# Altium schematic symbol library TI Power Management Shunt Voltage Reference.SchLib: 1526 symbols (part 14 of 18)
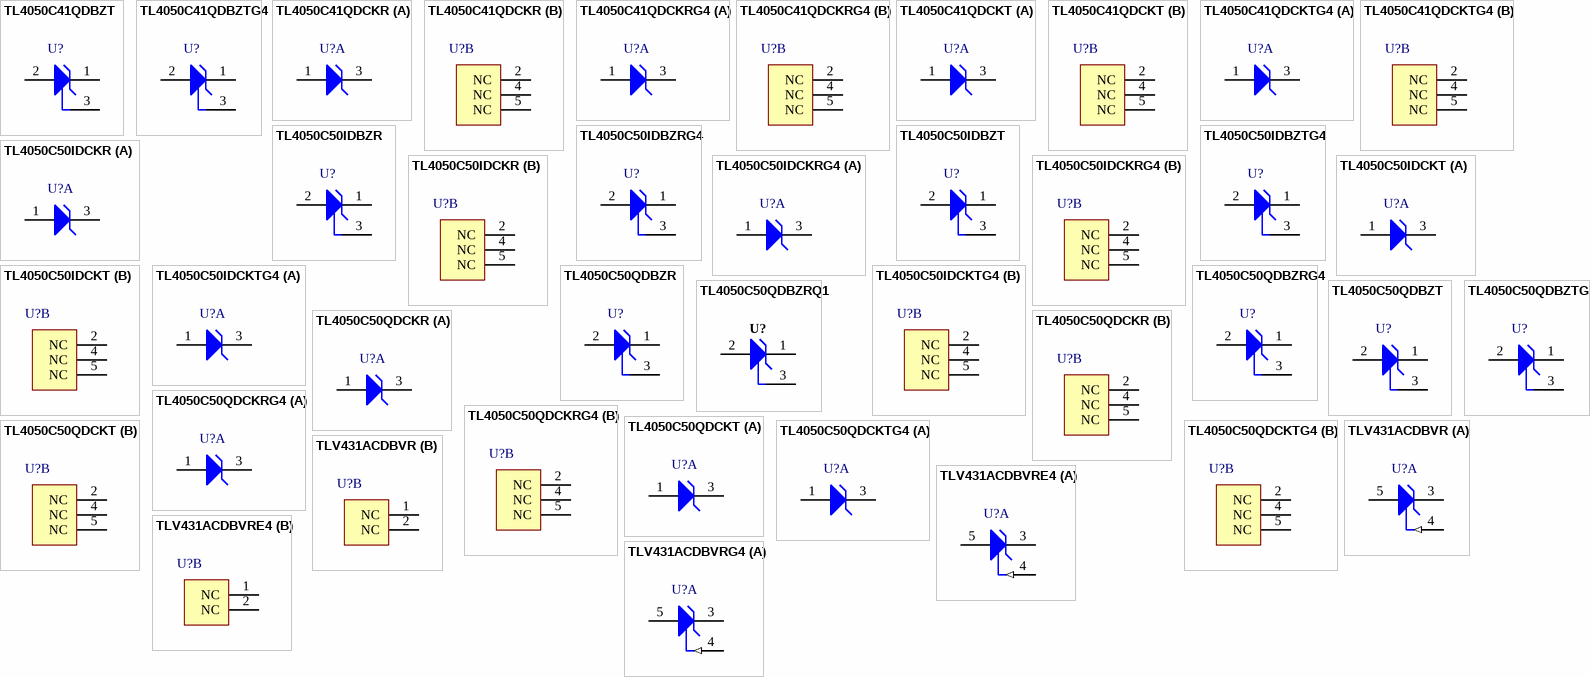
[diagram p70: symbols TL4050C41QDBZT to TLV431ACDBVRG4]

## TL4050C50QDCKR
designator U?
Precision Micropower Shunt Voltage Reference, 5 V, -40 to 125 degC, 5-pin SC70 (DCK), Green (RoHS & no Sb/Br); Manufacturer: Texas Instruments; PartNumber: TL4050C50QDCKR; Initial Accuracy @ 25/deg C(%): 0.5; Rating: Catalog; Temp Coeff(Max)(ppm/ degree C): 50; VO(V): 5; DatasheetVersion: SLOS486A; PackageReference: DCK5; PackageDescription: 5-Pin Plastic Small-Outline Package, 2 x 1.3 mm Body, 0.65 mm Pitch, 2.1 mm Lead Span; Supplier 1: Digi-Key; Supplier Part Number 1: 296-22826-2-ND; Supplier 2: Digi-Key; Supplier Part Number 2: 296-22826-1-ND; Supplier 3: Digi-Key; Supplier Part Number 3: 296-22826-6-ND; Supplier 4: Newark; Supplier Part Number 4: 46M1023; Supplier 5: Mouser; Supplier Part Number 5: 595-TL4050C50QDCKR; Eco-Plan: Green (RoHS & no Sb/Br); SubFamily: Shunt Voltage Reference; Mounting Technology: Surface Mount; Code_JEDEC: MO-203; ComponentLink1Description: Manufacturer URL; ComponentLink1URL: http://www.ti.com/; ComponentLink2Description: Datasheet; ComponentLink2URL: http://www.ti.com/general/docs/lit/getliterature.tsp?genericPartNumber=TL4050C50&fileType=pdf; ComponentLink3Description: Package Specification; ComponentLink3URL: http://www.ti.com/litv/pdf/mpds025f
footprint TI-DCK5_N (SOT353, 5-Leads, Body 2x1.3mm, Pitch 0.65mm, Lead Span 2.1mm, IPC Medium Density)
part A pins: 1 ANODE, 3 CATHODE
part B pins: 2 NC "No internal connection", 4 NC "No internal connection", 5 NC "No internal connection"

## TL4050C50QDCKRG4
designator U?
Precision Micropower Shunt Voltage Reference, 5 V, -40 to 125 degC, 5-pin SC70 (DCK), Green (RoHS & no Sb/Br); Manufacturer: Texas Instruments; PartNumber: TL4050C50QDCKRG4; Initial Accuracy @ 25/deg C(%): 0.5; Rating: Catalog; Temp Coeff(Max)(ppm/ degree C): 50; VO(V): 5; DatasheetVersion: SLOS486A; PackageReference: DCK5; PackageDescription: 5-Pin Plastic Small-Outline Package, 2 x 1.3 mm Body, 0.65 mm Pitch, 2.1 mm Lead Span; Supplier 1: Digi-Key; Supplier Part Number 1: TL4050C50QDCKRG4-ND; Supplier 2: Newark; Supplier Part Number 2: 46M9218; Supplier 3: Mouser; Supplier Part Number 3: 595-TL4050C50QDCKRG4; Eco-Plan: Green (RoHS & no Sb/Br); SubFamily: Shunt Voltage Reference; Mounting Technology: Surface Mount; Code_JEDEC: MO-203; ComponentLink1Description: Manufacturer URL; ComponentLink1URL: http://www.ti.com/; ComponentLink2Description: Datasheet; ComponentLink2URL: http://www.ti.com/general/docs/lit/getliterature.tsp?genericPartNumber=TL4050C50&fileType=pdf; ComponentLink3Description: Package Specification; ComponentLink3URL: http://www.ti.com/litv/pdf/mpds025f
footprint TI-DCK5_N (SOT353, 5-Leads, Body 2x1.3mm, Pitch 0.65mm, Lead Span 2.1mm, IPC Medium Density)
part A pins: 1 ANODE, 3 CATHODE
part B pins: 2 NC "No internal connection", 4 NC "No internal connection", 5 NC "No internal connection"

## TL4050C50QDCKT
designator U?
Precision Micropower Shunt Voltage Reference, 5 V, -40 to 125 degC, 5-pin SC70 (DCK), Green (RoHS & no Sb/Br); Manufacturer: Texas Instruments; PartNumber: TL4050C50QDCKT; Initial Accuracy @ 25/deg C(%): 0.5; Rating: Catalog; VO(V): 5; DatasheetVersion: SLOS486A; PackageReference: DCK5; PackageDescription: 5-Pin Plastic Small-Outline Package, 2 x 1.3 mm Body, 0.65 mm Pitch, 2.1 mm Lead Span; Supplier 1: Digi-Key; Supplier Part Number 1: TL4050C50QDCKT-ND; Supplier 2: Mouser; Supplier Part Number 2: 595-TL4050C50QDCKT; Eco-Plan: Green (RoHS & no Sb/Br); SubFamily: Shunt Voltage Reference; Mounting Technology: Surface Mount; Code_JEDEC: MO-203; ComponentLink1Description: Manufacturer URL; ComponentLink1URL: http://www.ti.com/; ComponentLink2Description: Datasheet; ComponentLink2URL: http://www.ti.com/general/docs/lit/getliterature.tsp?genericPartNumber=TL4050C50&fileType=pdf; ComponentLink3Description: Package Specification; ComponentLink3URL: http://www.ti.com/litv/pdf/mpds025f; ComponentLink4Description: URL Link1; ComponentLink4URL: Samples URL:http://www.ti.com/general/docs/lit/getliterature.tsp?genericPartNumber=tl4050c50&fileType=pdf
footprint TI-DCK5_N (SOT353, 5-Leads, Body 2x1.3mm, Pitch 0.65mm, Lead Span 2.1mm, IPC Medium Density)
part A pins: 1 ANODE, 3 CATHODE
part B pins: 2 NC "No internal connection", 4 NC "No internal connection", 5 NC "No internal connection"

## TL4050C50QDCKTG4
designator U?
Precision Micropower Shunt Voltage Reference, 5 V, -40 to 125 degC, 5-pin SC70 (DCK), Green (RoHS & no Sb/Br); Manufacturer: Texas Instruments; PartNumber: TL4050C50QDCKTG4; Initial Accuracy @ 25/deg C(%): 0.5; Rating: Catalog; VO(V): 5; DatasheetVersion: SLOS486A; PackageReference: DCK5; PackageDescription: 5-Pin Plastic Small-Outline Package, 2 x 1.3 mm Body, 0.65 mm Pitch, 2.1 mm Lead Span; Supplier 1: Digi-Key; Supplier Part Number 1: TL4050C50QDCKTG4-ND; Supplier 2: Mouser; Supplier Part Number 2: 595-TL4050C50QDCKTG4; Eco-Plan: Green (RoHS & no Sb/Br); SubFamily: Shunt Voltage Reference; Mounting Technology: Surface Mount; Code_JEDEC: MO-203; ComponentLink1Description: Manufacturer URL; ComponentLink1URL: http://www.ti.com/; ComponentLink2Description: Datasheet; ComponentLink2URL: http://www.ti.com/general/docs/lit/getliterature.tsp?genericPartNumber=TL4050C50&fileType=pdf; ComponentLink3Description: Package Specification; ComponentLink3URL: http://www.ti.com/litv/pdf/mpds025f; ComponentLink4Description: URL Link1; ComponentLink4URL: Samples URL:http://www.ti.com/general/docs/lit/getliterature.tsp?genericPartNumber=tl4050c50&fileType=pdf
footprint TI-DCK5_N (SOT353, 5-Leads, Body 2x1.3mm, Pitch 0.65mm, Lead Span 2.1mm, IPC Medium Density)
part A pins: 1 ANODE, 3 CATHODE
part B pins: 2 NC "No internal connection", 4 NC "No internal connection", 5 NC "No internal connection"

## TLV431ACDBVR
designator U?
Low Voltage Adjustable Precision Shunt Regulator, 39 ppm / degC, 15 mA, 0 to 70 degC, 5-pin SOT-23 (DBV), Green (RoHS & no Sb/Br); Manufacturer: Texas Instruments; PartNumber: TLV431ACDBVR; Iout/Iz(Max)(mA): 15; Min Iz for Regulation(uA): 80; Rating: Catalog; SubFamily: Shunt Voltage Reference; Temp Coeff(Max)(ppm/ degree C): 129; Temp Coeff(Typ)(ppm/ degree C): 39; VO Adj(Max)(V): 6; VO Adj(Min)(V): 1.24; DatasheetVersion: SLVS139T; PackageVersion: 4073253-4/K; PackageReference: DBV5; PackageDescription: 5-Pin Plastic Small Outline, Body 1.60 ?2.90 mm, Pitch 0.95 mm; Supplier 1: Digi-Key; Supplier Part Number 1: 296-1348-2-ND; Supplier 2: Digi-Key; Supplier Part Number 2: 296-1348-1-ND; Supplier 3: Digi-Key; Supplier Part Number 3: 296-1348-6-ND; Supplier 4: Farnell; Supplier Part Number 4: 1287662; Supplier 5: Newark; Supplier Part Number 5: 76K1064; Supplier 6: Mouser; Supplier Part Number 6: 595-TLV431ACDBVR; Eco-Plan: Green (RoHS & no Sb/Br); Mounting Technology: Surface Mount; Code_JEDEC: MO-178; ComponentLink1Description: Manufacturer URL; ComponentLink1URL: http://www.ti.com/; ComponentLink2Description: Datasheet; ComponentLink2URL: http://www.ti.com/general/docs/lit/getliterature.tsp?genericPartNumber=TLV431A&fileType=pdf; ComponentLink3Description: Package Specification; ComponentLink3URL: http://www.ti.com/litv/pdf/mpds018i
footprint TI-DBV5_N (SOT23, 5-Leads, Body 2.9x1.6mm, Pitch 0.95mm, IPC Medium Density)
part A pins: 3 CATHODE, 4 REF (in), 5 ANODE
part B pins: 1 NC "No internal connection", 2 NC "No internal connection"

## TLV431ACDBVRE4
designator U?
Low Voltage Adjustable Precision Shunt Regulator, 39 ppm / degC, 15 mA, 0 to 70 degC, 5-pin SOT-23 (DBV), Green (RoHS & no Sb/Br); Manufacturer: Texas Instruments; PartNumber: TLV431ACDBVRE4; Iout/Iz(Max)(mA): 15; Min Iz for Regulation(uA): 80; Rating: Catalog; SubFamily: Shunt Voltage Reference; Temp Coeff(Max)(ppm/ degree C): 129; Temp Coeff(Typ)(ppm/ degree C): 39; VO Adj(Max)(V): 6; VO Adj(Min)(V): 1.24; DatasheetVersion: SLVS139T; PackageVersion: 4073253-4/K; PackageReference: DBV5; PackageDescription: 5-Pin Plastic Small Outline, Body 1.60 ?2.90 mm, Pitch 0.95 mm; Supplier 1: Digi-Key; Supplier Part Number 1: TLV431ACDBVRE4-ND; Supplier 2: Newark; Supplier Part Number 2: 40K9631; Supplier 3: Mouser; Supplier Part Number 3: 595-TLV431ACDBVRE4; Eco-Plan: Green (RoHS & no Sb/Br); Mounting Technology: Surface Mount; Code_JEDEC: MO-178; ComponentLink1Description: Manufacturer URL; ComponentLink1URL: http://www.ti.com/; ComponentLink2Description: Datasheet; ComponentLink2URL: http://www.ti.com/general/docs/lit/getliterature.tsp?genericPartNumber=TLV431A&fileType=pdf; ComponentLink3Description: Package Specification; ComponentLink3URL: http://www.ti.com/litv/pdf/mpds018i
footprint TI-DBV5_N (SOT23, 5-Leads, Body 2.9x1.6mm, Pitch 0.95mm, IPC Medium Density)
part A pins: 3 CATHODE, 4 REF (in), 5 ANODE
part B pins: 1 NC "No internal connection", 2 NC "No internal connection"

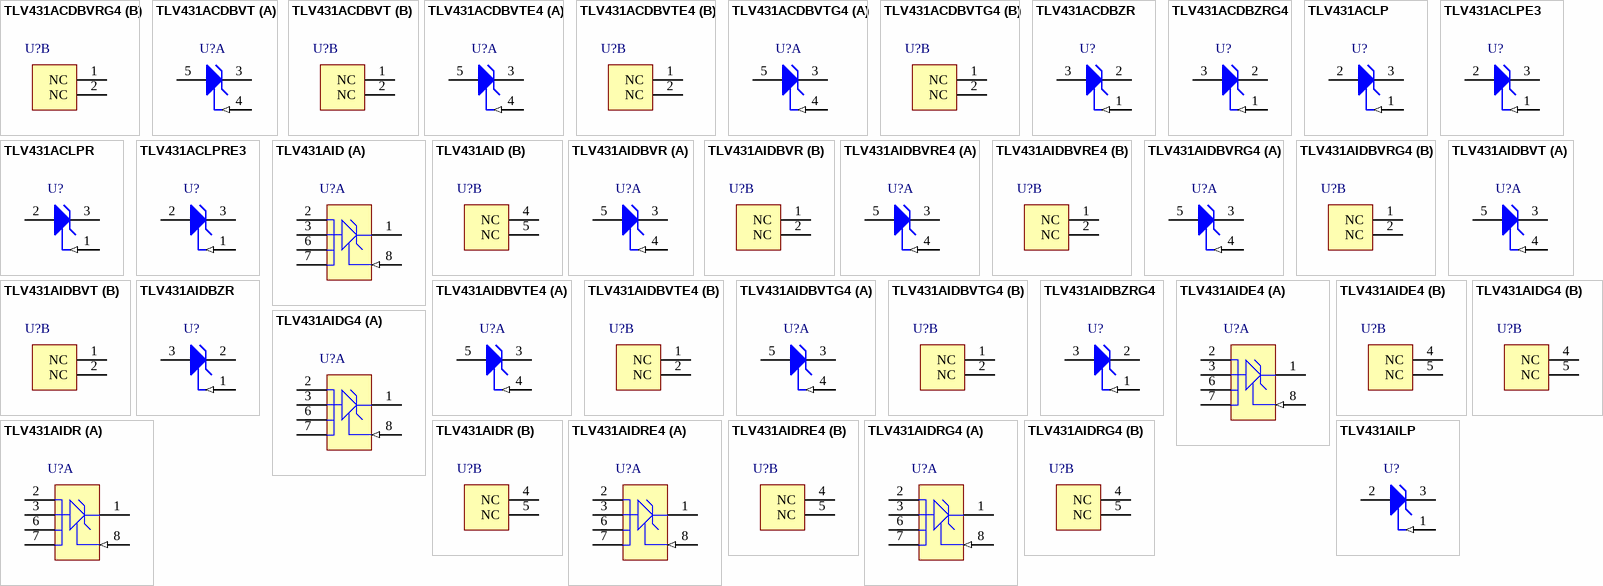
[diagram p43: symbols TLV431ACDBVRG4 to TLV431AILP]

## TLV431ACDBVRG4
designator U?
Low Voltage Adjustable Precision Shunt Regulator, 39 ppm / degC, 15 mA, 0 to 70 degC, 5-pin SOT-23 (DBV), Green (RoHS & no Sb/Br); Manufacturer: Texas Instruments; PartNumber: TLV431ACDBVRG4; Iout/Iz(Max)(mA): 15; Min Iz for Regulation(uA): 80; Rating: Catalog; SubFamily: Shunt Voltage Reference; Temp Coeff(Max)(ppm/ degree C): 129; Temp Coeff(Typ)(ppm/ degree C): 39; VO Adj(Max)(V): 6; VO Adj(Min)(V): 1.24; DatasheetVersion: SLVS139T; PackageVersion: 4073253-4/K; PackageReference: DBV5; PackageDescription: 5-Pin Plastic Small Outline, Body 1.60 ?2.90 mm, Pitch 0.95 mm; Supplier 1: Digi-Key; Supplier Part Number 1: TLV431ACDBVRG4-ND; Supplier 2: Farnell; Supplier Part Number 2: 1287663; Supplier 3: Newark; Supplier Part Number 3: 26M4181; Supplier 4: Mouser; Supplier Part Number 4: 595-TLV431ACDBVRG4; Eco-Plan: Green (RoHS & no Sb/Br); Mounting Technology: Surface Mount; Code_JEDEC: MO-178; ComponentLink1Description: Manufacturer URL; ComponentLink1URL: http://www.ti.com/; ComponentLink2Description: Datasheet; ComponentLink2URL: http://www.ti.com/general/docs/lit/getliterature.tsp?genericPartNumber=TLV431A&fileType=pdf; ComponentLink3Description: Package Specification; ComponentLink3URL: http://www.ti.com/litv/pdf/mpds018i
footprint TI-DBV5_N (SOT23, 5-Leads, Body 2.9x1.6mm, Pitch 0.95mm, IPC Medium Density)
part A pins: 3 CATHODE, 4 REF (in), 5 ANODE
part B pins: 1 NC "No internal connection", 2 NC "No internal connection"

## TLV431ACDBVT
designator U?
Low Voltage Adjustable Precision Shunt Regulator, 39 ppm / degC, 15 mA, 0 to 70 degC, 5-pin SOT-23 (DBV), Green (RoHS & no Sb/Br); Manufacturer: Texas Instruments; PartNumber: TLV431ACDBVT; Iout/Iz(Max)(mA): 15; Min Iz for Regulation(uA): 80; Rating: Catalog; SubFamily: Shunt Voltage Reference; Temp Coeff(Max)(ppm/ degree C): 129; Temp Coeff(Typ)(ppm/ degree C): 39; VO Adj(Max)(V): 6; VO Adj(Min)(V): 1.24; DatasheetVersion: SLVS139T; PackageVersion: 4073253-4/K; PackageReference: DBV5; PackageDescription: 5-Pin Plastic Small Outline, Body 1.60 ?2.90 mm, Pitch 0.95 mm; Supplier 1: Digi-Key; Supplier Part Number 1: 296-32396-2-ND; Supplier 2: Digi-Key; Supplier Part Number 2: 296-32396-1-ND; Supplier 3: Digi-Key; Supplier Part Number 3: 296-32396-6-ND; Supplier 4: Mouser; Supplier Part Number 4: 595-TLV431ACDBVT; Eco-Plan: Green (RoHS & no Sb/Br); Mounting Technology: Surface Mount; Code_JEDEC: MO-178; ComponentLink1Description: Manufacturer URL; ComponentLink1URL: http://www.ti.com/; ComponentLink2Description: Datasheet; ComponentLink2URL: http://www.ti.com/general/docs/lit/getliterature.tsp?genericPartNumber=TLV431A&fileType=pdf; ComponentLink3Description: Package Specification; ComponentLink3URL: http://www.ti.com/litv/pdf/mpds018i
footprint TI-DBV5_N (SOT23, 5-Leads, Body 2.9x1.6mm, Pitch 0.95mm, IPC Medium Density)
part A pins: 3 CATHODE, 4 REF (in), 5 ANODE
part B pins: 1 NC "No internal connection", 2 NC "No internal connection"

## TLV431ACDBVTE4
designator U?
Low Voltage Adjustable Precision Shunt Regulator, 39 ppm / degC, 15 mA, 0 to 70 degC, 5-pin SOT-23 (DBV), Green (RoHS & no Sb/Br); Manufacturer: Texas Instruments; PartNumber: TLV431ACDBVTE4; Iout/Iz(Max)(mA): 15; Min Iz for Regulation(uA): 80; Rating: Catalog; SubFamily: Shunt Voltage Reference; Temp Coeff(Max)(ppm/ degree C): 129; Temp Coeff(Typ)(ppm/ degree C): 39; VO Adj(Max)(V): 6; VO Adj(Min)(V): 1.24; DatasheetVersion: SLVS139T; PackageVersion: 4073253-4/K; PackageReference: DBV5; PackageDescription: 5-Pin Plastic Small Outline, Body 1.60 ?2.90 mm, Pitch 0.95 mm; Supplier 1: Digi-Key; Supplier Part Number 1: TLV431ACDBVTE4-ND; Supplier 2: Mouser; Supplier Part Number 2: 595-TLV431ACDBVTE4; Eco-Plan: Green (RoHS & no Sb/Br); Mounting Technology: Surface Mount; Code_JEDEC: MO-178; ComponentLink1Description: Manufacturer URL; ComponentLink1URL: http://www.ti.com/; ComponentLink2Description: Datasheet; ComponentLink2URL: http://www.ti.com/general/docs/lit/getliterature.tsp?genericPartNumber=TLV431A&fileType=pdf; ComponentLink3Description: Package Specification; ComponentLink3URL: http://www.ti.com/litv/pdf/mpds018i
footprint TI-DBV5_N (SOT23, 5-Leads, Body 2.9x1.6mm, Pitch 0.95mm, IPC Medium Density)
part A pins: 3 CATHODE, 4 REF (in), 5 ANODE
part B pins: 1 NC "No internal connection", 2 NC "No internal connection"

## TLV431ACDBVTG4
designator U?
Low Voltage Adjustable Precision Shunt Regulator, 39 ppm / degC, 15 mA, 0 to 70 degC, 5-pin SOT-23 (DBV), Green (RoHS & no Sb/Br); Manufacturer: Texas Instruments; PartNumber: TLV431ACDBVTG4; Iout/Iz(Max)(mA): 15; Min Iz for Regulation(uA): 80; Rating: Catalog; SubFamily: Shunt Voltage Reference; Temp Coeff(Max)(ppm/ degree C): 129; Temp Coeff(Typ)(ppm/ degree C): 39; VO Adj(Max)(V): 6; VO Adj(Min)(V): 1.24; DatasheetVersion: SLVS139T; PackageVersion: 4073253-4/K; PackageReference: DBV5; PackageDescription: 5-Pin Plastic Small Outline, Body 1.60 ?2.90 mm, Pitch 0.95 mm; Supplier 1: Digi-Key; Supplier Part Number 1: TLV431ACDBVTG4-ND; Supplier 2: Newark; Supplier Part Number 2: 53M3977; Supplier 3: Mouser; Supplier Part Number 3: 595-TLV431ACDBVTG4; Eco-Plan: Green (RoHS & no Sb/Br); Mounting Technology: Surface Mount; Code_JEDEC: MO-178; ComponentLink1Description: Manufacturer URL; ComponentLink1URL: http://www.ti.com/; ComponentLink2Description: Datasheet; ComponentLink2URL: http://www.ti.com/general/docs/lit/getliterature.tsp?genericPartNumber=TLV431A&fileType=pdf; ComponentLink3Description: Package Specification; ComponentLink3URL: http://www.ti.com/litv/pdf/mpds018i
footprint TI-DBV5_N (SOT23, 5-Leads, Body 2.9x1.6mm, Pitch 0.95mm, IPC Medium Density)
part A pins: 3 CATHODE, 4 REF (in), 5 ANODE
part B pins: 1 NC "No internal connection", 2 NC "No internal connection"

## TLV431ACDBZR
designator U?
Low Voltage Adjustable Precision Shunt Regulator, 39 ppm / degC, 15 mA, 0 to 70 degC, 3-pin SOT-23 (DBZ), Green (RoHS & no Sb/Br); Manufacturer: Texas Instruments; PartNumber: TLV431ACDBZR; Iout/Iz(Max)(mA): 15; Min Iz for Regulation(uA): 80; Rating: Catalog; SubFamily: Shunt Voltage Reference; Temp Coeff(Max)(ppm/ degree C): 129; Temp Coeff(Typ)(ppm/ degree C): 39; VO Adj(Max)(V): 6; VO Adj(Min)(V): 1.24; DatasheetVersion: SLVS139T; PackageVersion: 4203227/B; PackageReference: DBZ3; PackageDescription: 3-Pin Plastic Small Outline, Body 2.92 x 1.3 mm, Pitch 0.95 mm; Supplier 1: Digi-Key; Supplier Part Number 1: 296-18912-2-ND; Supplier 2: Digi-Key; Supplier Part Number 2: 296-18912-1-ND; Supplier 3: Digi-Key; Supplier Part Number 3: 296-18912-6-ND; Supplier 4: Newark; Supplier Part Number 4: 21J9150; Supplier 5: Mouser; Supplier Part Number 5: 595-TLV431ACDBZR; Eco-Plan: Green (RoHS & no Sb/Br); Mounting Technology: Surface Mount; Code_JEDEC: TO-236; ComponentLink1Description: Manufacturer URL; ComponentLink1URL: http://www.ti.com/; ComponentLink2Description: Datasheet; ComponentLink2URL: http://www.ti.com/general/docs/lit/getliterature.tsp?genericPartNumber=TLV431A&fileType=pdf; ComponentLink3Description: Package Specification; ComponentLink3URL: http://www.ti.com/litv/pdf/mpds108a
footprint TI-DBZ3_N (SOT23, 3-Leads, Body 2.92x1.3 mm, Pitch 0.95 mm, IPC Medium Density)
pins: 1 REF (in), 2 CATHODE, 3 ANODE

## TLV431ACDBZRG4
designator U?
Low Voltage Adjustable Precision Shunt Regulator, 39 ppm / degC, 15 mA, 0 to 70 degC, 3-pin SOT-23 (DBZ), Green (RoHS & no Sb/Br); Manufacturer: Texas Instruments; PartNumber: TLV431ACDBZRG4; Iout/Iz(Max)(mA): 15; Min Iz for Regulation(uA): 80; Rating: Catalog; SubFamily: Shunt Voltage Reference; Temp Coeff(Max)(ppm/ degree C): 129; Temp Coeff(Typ)(ppm/ degree C): 39; VO Adj(Max)(V): 6; VO Adj(Min)(V): 1.24; DatasheetVersion: SLVS139T; PackageVersion: 4203227/B; PackageReference: DBZ3; PackageDescription: 3-Pin Plastic Small Outline, Body 2.92 x 1.3 mm, Pitch 0.95 mm; Supplier 1: Digi-Key; Supplier Part Number 1: TLV431ACDBZRG4-ND; Supplier 2: Newark; Supplier Part Number 2: 31K7719; Supplier 3: Mouser; Supplier Part Number 3: 595-TLV431ACDBZRG4; Eco-Plan: Green (RoHS & no Sb/Br); Mounting Technology: Surface Mount; Code_JEDEC: TO-236; ComponentLink1Description: Manufacturer URL; ComponentLink1URL: http://www.ti.com/; ComponentLink2Description: Datasheet; ComponentLink2URL: http://www.ti.com/general/docs/lit/getliterature.tsp?genericPartNumber=TLV431A&fileType=pdf; ComponentLink3Description: Package Specification; ComponentLink3URL: http://www.ti.com/litv/pdf/mpds108a
footprint TI-DBZ3_N (SOT23, 3-Leads, Body 2.92x1.3 mm, Pitch 0.95 mm, IPC Medium Density)
pins: 1 REF (in), 2 CATHODE, 3 ANODE

## TLV431ACLP
designator U?
Low Voltage Adjustable Precision Shunt Regulator, 39 ppm / degC, 15 mA, 0 to 70 degC, 3-pin TO-92 (LP), Pb-Free (RoHS); Manufacturer: Texas Instruments; PartNumber: TLV431ACLP; Iout/Iz(Max)(mA): 15; Min Iz for Regulation(uA): 80; Rating: Catalog; SubFamily: Shunt Voltage Reference; Temp Coeff(Max)(ppm/ degree C): 129; Temp Coeff(Typ)(ppm/ degree C): 39; VO Adj(Max)(V): 6; VO Adj(Min)(V): 1.24; DatasheetVersion: SLVS139T; PackageVersion: 4040001-2/C; PackageReference: LP3; PackageDescription: Plastic Cylindrical Package, Formed Lead Option (TO-92); Supplier 1: Digi-Key; Supplier Part Number 1: 296-10723-5-ND; Supplier 2: Farnell; Supplier Part Number 2: 1510225; Supplier 3: Newark; Supplier Part Number 3: 52F3978; Supplier 4: Mouser; Supplier Part Number 4: 595-TLV431ACLP; Eco-Plan: Pb-Free (RoHS); Mounting Technology: Through Hole; Code_JEDEC: TO-226; ComponentLink1Description: Manufacturer URL; ComponentLink1URL: http://www.ti.com/; ComponentLink2Description: Datasheet; ComponentLink2URL: http://www.ti.com/general/docs/lit/getliterature.tsp?genericPartNumber=TLV431A&fileType=pdf; ComponentLink3Description: Package Specification; ComponentLink3URL: http://www.ti.com/litv/pdf/msot002a
footprint TI-LP3 (TO, Flat Index; 3 In-Line, Formed Axial Leads; Body Dia. 4.8mm; Leads 0.56 x 0.41 mm (max))
pins: 1 REF (in), 2 ANODE, 3 CATHODE

## TLV431ACLPE3
designator U?
Low Voltage Adjustable Precision Shunt Regulator, 39 ppm / degC, 15 mA, 0 to 70 degC, 3-pin TO-92 (LP), Pb-Free (RoHS); Manufacturer: Texas Instruments; PartNumber: TLV431ACLPE3; Initial Accuracy @ 25/deg C(%): 1; Iout/Iz(Max)(mA): 15; Min Iz for Regulation(uA): 80; Rating: Catalog; SubFamily: Shunt Voltage Reference; Temp Coeff(Max)(ppm/ degree C): 129; Temp Coeff(Typ)(ppm/ degree C): 39; VO Adj(Max)(V): 6; VO Adj(Min)(V): 1.24; DatasheetVersion: SLVS139T; PackageVersion: 4040001-2/C; PackageReference: LP3; PackageDescription: Plastic Cylindrical Package, Formed Lead Option (TO-92); Supplier 1: Digi-Key; Supplier Part Number 1: TLV431ACLPE3-ND; Supplier 2: Mouser; Supplier Part Number 2: 595-TLV431ACLPE3; Eco-Plan: Pb-Free (RoHS); Mounting Technology: Through Hole; Code_JEDEC: TO-226; ComponentLink1Description: Manufacturer URL; ComponentLink1URL: http://www.ti.com/; ComponentLink2Description: Datasheet; ComponentLink2URL: http://www.ti.com/general/docs/lit/getliterature.tsp?genericPartNumber=TLV431A&fileType=pdf; ComponentLink3Description: Package Specification; ComponentLink3URL: http://www.ti.com/litv/pdf/msot002a
footprint TI-LP3 (TO, Flat Index; 3 In-Line, Formed Axial Leads; Body Dia. 4.8mm; Leads 0.56 x 0.41 mm (max))
pins: 1 REF (in), 2 ANODE, 3 CATHODE

## TLV431ACLPR
designator U?
Low Voltage Adjustable Precision Shunt Regulator, 39 ppm / degC, 15 mA, 0 to 70 degC, 3-pin TO-92 (LP), Pb-Free (RoHS); Manufacturer: Texas Instruments; PartNumber: TLV431ACLPR; Iout/Iz(Max)(mA): 15; Min Iz for Regulation(uA): 80; Rating: Catalog; SubFamily: Shunt Voltage Reference; Temp Coeff(Max)(ppm/ degree C): 129; Temp Coeff(Typ)(ppm/ degree C): 39; VO Adj(Max)(V): 6; VO Adj(Min)(V): 1.24; DatasheetVersion: SLVS139T; PackageVersion: 4040001-2/C; PackageReference: LP3; PackageDescription: Plastic Cylindrical Package, Formed Lead Option (TO-92); Supplier 1: Digi-Key; Supplier Part Number 1: 296-31458-2-ND; Supplier 2: Digi-Key; Supplier Part Number 2: 296-31458-1-ND; Supplier 3: Newark; Supplier Part Number 3: 76C8856; Supplier 4: Mouser; Supplier Part Number 4: 595-TLV431ACLPR; Eco-Plan: Pb-Free (RoHS); Mounting Technology: Through Hole; Code_JEDEC: TO-226; ComponentLink1Description: Manufacturer URL; ComponentLink1URL: http://www.ti.com/; ComponentLink2Description: Datasheet; ComponentLink2URL: http://www.ti.com/general/docs/lit/getliterature.tsp?genericPartNumber=TLV431A&fileType=pdf; ComponentLink3Description: Package Specification; ComponentLink3URL: http://www.ti.com/litv/pdf/msot002a
footprint TI-LP3 (TO, Flat Index; 3 In-Line, Formed Axial Leads; Body Dia. 4.8mm; Leads 0.56 x 0.41 mm (max))
pins: 1 REF (in), 2 ANODE, 3 CATHODE

## TLV431ACLPRE3
designator U?
Low Voltage Adjustable Precision Shunt Regulator, 39 ppm / degC, 15 mA, 0 to 70 degC, 3-pin TO-92 (LP), Pb-Free (RoHS); Manufacturer: Texas Instruments; PartNumber: TLV431ACLPRE3; Initial Accuracy @ 25/deg C(%): 1; Iout/Iz(Max)(mA): 15; Min Iz for Regulation(uA): 80; Rating: Catalog; SubFamily: Shunt Voltage Reference; Temp Coeff(Max)(ppm/ degree C): 129; Temp Coeff(Typ)(ppm/ degree C): 39; VO Adj(Max)(V): 6; VO Adj(Min)(V): 1.24; DatasheetVersion: SLVS139T; PackageVersion: 4040001-2/C; PackageReference: LP3; PackageDescription: Plastic Cylindrical Package, Formed Lead Option (TO-92); Supplier 1: Digi-Key; Supplier Part Number 1: TLV431ACLPRE3-ND; Supplier 2: Mouser; Supplier Part Number 2: 595-TLV431ACLPRE3; Eco-Plan: Pb-Free (RoHS); Mounting Technology: Through Hole; Code_JEDEC: TO-226; ComponentLink1Description: Manufacturer URL; ComponentLink1URL: http://www.ti.com/; ComponentLink2Description: Datasheet; ComponentLink2URL: http://www.ti.com/general/docs/lit/getliterature.tsp?genericPartNumber=TLV431A&fileType=pdf; ComponentLink3Description: Package Specification; ComponentLink3URL: http://www.ti.com/litv/pdf/msot002a
footprint TI-LP3 (TO, Flat Index; 3 In-Line, Formed Axial Leads; Body Dia. 4.8mm; Leads 0.56 x 0.41 mm (max))
pins: 1 REF (in), 2 ANODE, 3 CATHODE

## TLV431AID
designator U?
Low Voltage Adjustable Precision Shunt Regulator, 39 ppm / degC, 15 mA, -40 to 85 degC, 8-pin SOIC (D), Green (RoHS & no Sb/Br); Manufacturer: Texas Instruments; PartNumber: TLV431AID; Iout/Iz(Max)(mA): 15; Min Iz for Regulation(uA): 80; Rating: Catalog; SubFamily: Shunt Voltage Reference; Temp Coeff(Max)(ppm/ degree C): 129; Temp Coeff(Typ)(ppm/ degree C): 39; VO Adj(Max)(V): 6; VO Adj(Min)(V): 1.24; DatasheetVersion: SLVS139T; PackageVersion: 4040047-3/M; PackageReference: D8; PackageDescription: 8-Pin Plastic Small Outline, Body 4.9 x 3.9 mm, Pitch 1.27 mm; Supplier 1: Digi-Key; Supplier Part Number 1: 296-10724-5-ND; Supplier 2: Farnell; Supplier Part Number 2: 1103114; Supplier 3: Mouser; Supplier Part Number 3: 595-TLV431AID; Eco-Plan: Green (RoHS & no Sb/Br); Mounting Technology: Surface Mount; Code_JEDEC: MS-012; ComponentLink1Description: Manufacturer URL; ComponentLink1URL: http://www.ti.com/; ComponentLink2Description: Datasheet; ComponentLink2URL: http://www.ti.com/general/docs/lit/getliterature.tsp?genericPartNumber=TLV431A&fileType=pdf; ComponentLink3Description: Package Specification; ComponentLink3URL: http://www.ti.com/litv/pdf/msoi002j
footprint TI-D8_N (SOIC, 8-Leads, Body 4.9x3.9mm, Pitch 1.27mm, IPC Medium Density)
part A pins: 1 CATHODE, 2 ANODE, 3 ANAODE, 6 ANODE, 7 ANODE, 8 REF (in)
part B pins: 4 NC, 5 NC
